# Altium schematic symbol library Regulator_Linear.SchLib: 1452 symbols (part 2 of 10)
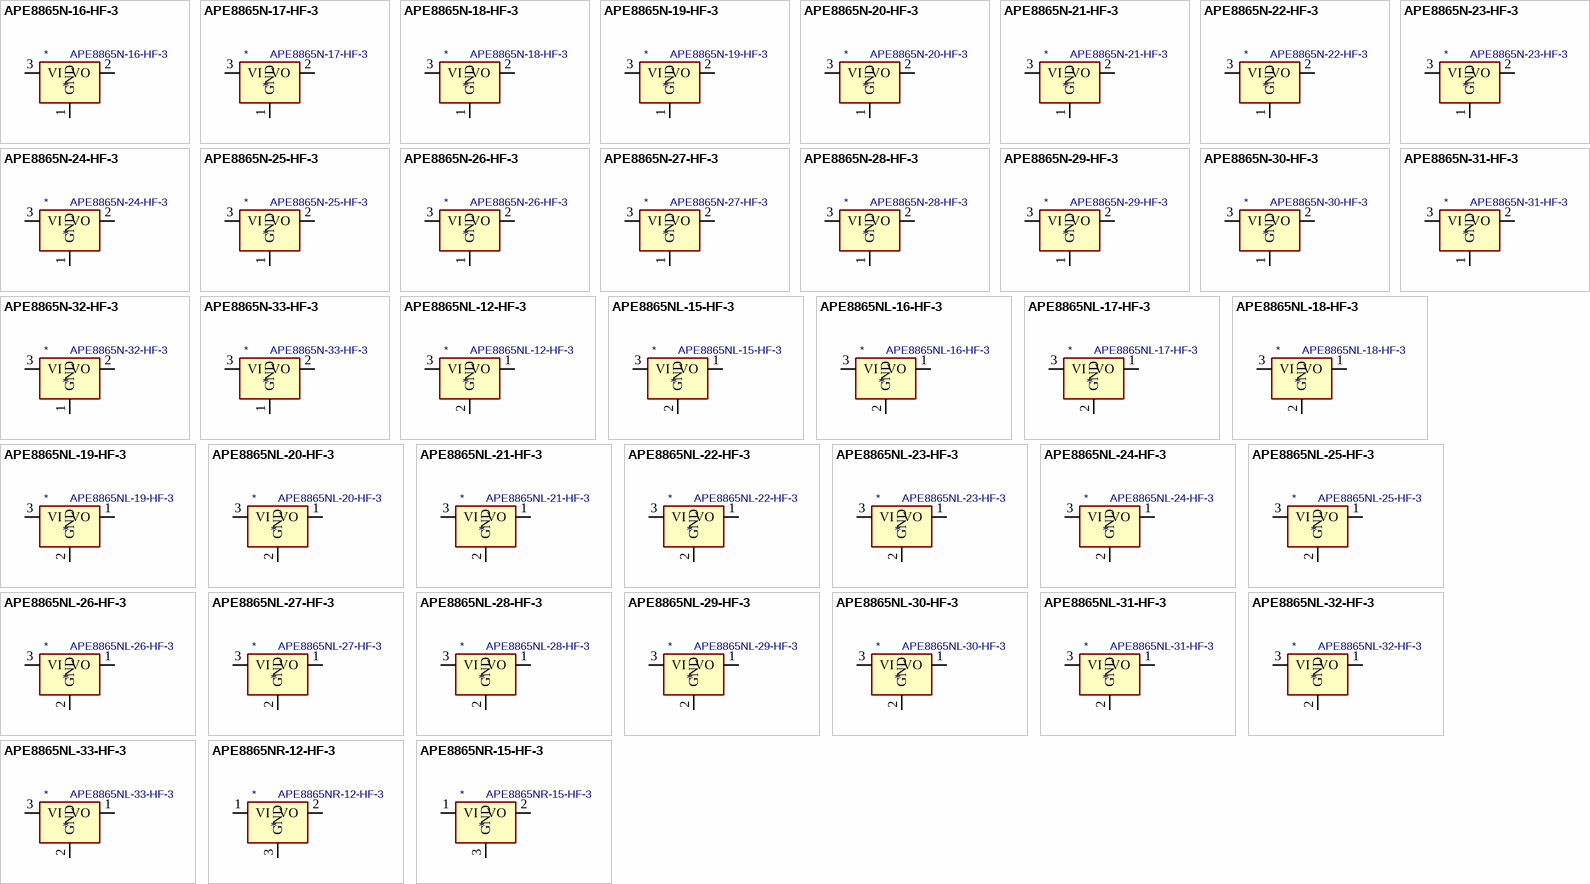
[diagram p37: symbols APE8865N-16-HF-3 to APE8865NR-15-HF-3]

## APE8865NR-15-HF-3
designator *  value APE8865NR-15-HF-3
ki_keywords: 300mA LDO Regulator Fixed Positive; ki_description: 300mA Low Dropout Voltage Regulator, Fixed Output 1.5V, SOT-23; ki_fp_filters: SOT?23*; Footprint: Package_TO_SOT_SMD:SOT-23; Supplier: http://www.tme.eu/fr/Document/ced3461ed31ea70a3c416fb648e0cde7/APE8865-3.pdf
footprint SOT-23
pins: 1 VI (power), 2 VO (power), 3 GND (power)

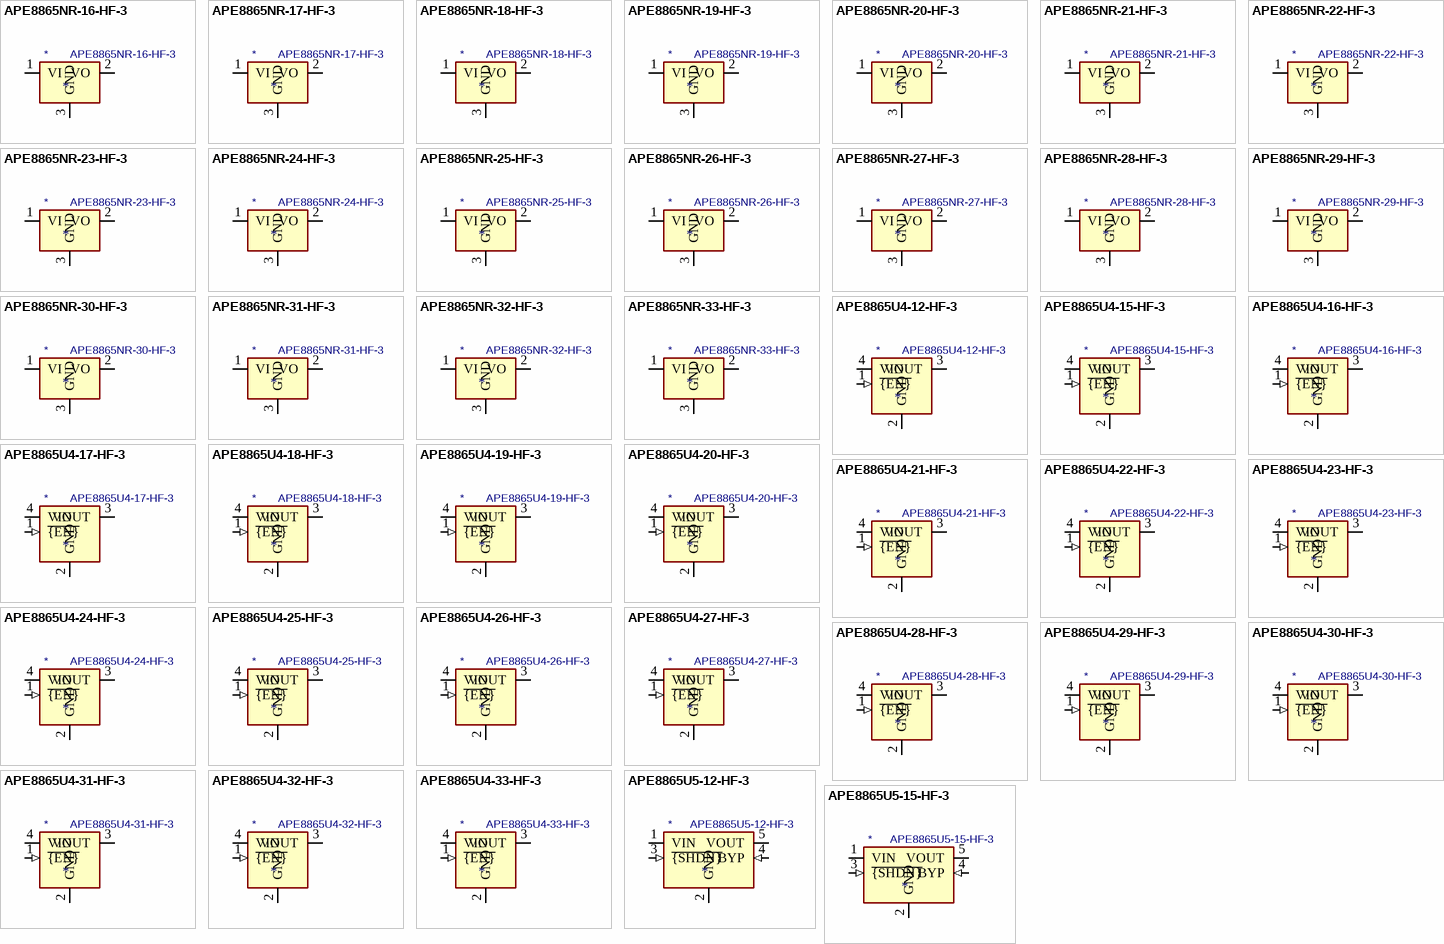
[diagram p4: symbols APE8865NR-16-HF-3 to APE8865U5-15-HF-3]

## APE8865NR-16-HF-3
designator *  value APE8865NR-16-HF-3
ki_keywords: 300mA LDO Regulator Fixed Positive; ki_description: 300mA Low Dropout Voltage Regulator, Fixed Output 1.6V, SOT-23; ki_fp_filters: SOT?23*; Footprint: Package_TO_SOT_SMD:SOT-23; Supplier: http://www.tme.eu/fr/Document/ced3461ed31ea70a3c416fb648e0cde7/APE8865-3.pdf
footprint SOT-23
pins: 1 VI (power), 2 VO (power), 3 GND (power)

## APE8865NR-17-HF-3
designator *  value APE8865NR-17-HF-3
ki_keywords: 300mA LDO Regulator Fixed Positive; ki_description: 300mA Low Dropout Voltage Regulator, Fixed Output 1.7V, SOT-23; ki_fp_filters: SOT?23*; Footprint: Package_TO_SOT_SMD:SOT-23; Supplier: http://www.tme.eu/fr/Document/ced3461ed31ea70a3c416fb648e0cde7/APE8865-3.pdf
footprint SOT-23
pins: 1 VI (power), 2 VO (power), 3 GND (power)

## APE8865NR-18-HF-3
designator *  value APE8865NR-18-HF-3
ki_keywords: 300mA LDO Regulator Fixed Positive; ki_description: 300mA Low Dropout Voltage Regulator, Fixed Output 1.8V, SOT-23; ki_fp_filters: SOT?23*; Footprint: Package_TO_SOT_SMD:SOT-23; Supplier: http://www.tme.eu/fr/Document/ced3461ed31ea70a3c416fb648e0cde7/APE8865-3.pdf
footprint SOT-23
pins: 1 VI (power), 2 VO (power), 3 GND (power)

## APE8865NR-19-HF-3
designator *  value APE8865NR-19-HF-3
ki_keywords: 300mA LDO Regulator Fixed Positive; ki_description: 300mA Low Dropout Voltage Regulator, Fixed Output 1.9V, SOT-23; ki_fp_filters: SOT?23*; Footprint: Package_TO_SOT_SMD:SOT-23; Supplier: http://www.tme.eu/fr/Document/ced3461ed31ea70a3c416fb648e0cde7/APE8865-3.pdf
footprint SOT-23
pins: 1 VI (power), 2 VO (power), 3 GND (power)

## APE8865NR-20-HF-3
designator *  value APE8865NR-20-HF-3
ki_keywords: 300mA LDO Regulator Fixed Positive; ki_description: 300mA Low Dropout Voltage Regulator, Fixed Output 2.0V, SOT-23; ki_fp_filters: SOT?23*; Footprint: Package_TO_SOT_SMD:SOT-23; Supplier: http://www.tme.eu/fr/Document/ced3461ed31ea70a3c416fb648e0cde7/APE8865-3.pdf
footprint SOT-23
pins: 1 VI (power), 2 VO (power), 3 GND (power)

## APE8865NR-21-HF-3
designator *  value APE8865NR-21-HF-3
ki_keywords: 300mA LDO Regulator Fixed Positive; ki_description: 300mA Low Dropout Voltage Regulator, Fixed Output 2.1V, SOT-23; ki_fp_filters: SOT?23*; Footprint: Package_TO_SOT_SMD:SOT-23; Supplier: http://www.tme.eu/fr/Document/ced3461ed31ea70a3c416fb648e0cde7/APE8865-3.pdf
footprint SOT-23
pins: 1 VI (power), 2 VO (power), 3 GND (power)

## APE8865NR-22-HF-3
designator *  value APE8865NR-22-HF-3
ki_keywords: 300mA LDO Regulator Fixed Positive; ki_description: 300mA Low Dropout Voltage Regulator, Fixed Output 2.2V, SOT-23; ki_fp_filters: SOT?23*; Footprint: Package_TO_SOT_SMD:SOT-23; Supplier: http://www.tme.eu/fr/Document/ced3461ed31ea70a3c416fb648e0cde7/APE8865-3.pdf
footprint SOT-23
pins: 1 VI (power), 2 VO (power), 3 GND (power)

## APE8865NR-23-HF-3
designator *  value APE8865NR-23-HF-3
ki_keywords: 300mA LDO Regulator Fixed Positive; ki_description: 300mA Low Dropout Voltage Regulator, Fixed Output 2.3V, SOT-23; ki_fp_filters: SOT?23*; Footprint: Package_TO_SOT_SMD:SOT-23; Supplier: http://www.tme.eu/fr/Document/ced3461ed31ea70a3c416fb648e0cde7/APE8865-3.pdf
footprint SOT-23
pins: 1 VI (power), 2 VO (power), 3 GND (power)

## APE8865NR-24-HF-3
designator *  value APE8865NR-24-HF-3
ki_keywords: 300mA LDO Regulator Fixed Positive; ki_description: 300mA Low Dropout Voltage Regulator, Fixed Output 2.4V, SOT-23; ki_fp_filters: SOT?23*; Footprint: Package_TO_SOT_SMD:SOT-23; Supplier: http://www.tme.eu/fr/Document/ced3461ed31ea70a3c416fb648e0cde7/APE8865-3.pdf
footprint SOT-23
pins: 1 VI (power), 2 VO (power), 3 GND (power)

## APE8865NR-25-HF-3
designator *  value APE8865NR-25-HF-3
ki_keywords: 300mA LDO Regulator Fixed Positive; ki_description: 300mA Low Dropout Voltage Regulator, Fixed Output 2.5V, SOT-23; ki_fp_filters: SOT?23*; Footprint: Package_TO_SOT_SMD:SOT-23; Supplier: http://www.tme.eu/fr/Document/ced3461ed31ea70a3c416fb648e0cde7/APE8865-3.pdf
footprint SOT-23
pins: 1 VI (power), 2 VO (power), 3 GND (power)

## APE8865NR-26-HF-3
designator *  value APE8865NR-26-HF-3
ki_keywords: 300mA LDO Regulator Fixed Positive; ki_description: 300mA Low Dropout Voltage Regulator, Fixed Output 2.6V, SOT-23; ki_fp_filters: SOT?23*; Footprint: Package_TO_SOT_SMD:SOT-23; Supplier: http://www.tme.eu/fr/Document/ced3461ed31ea70a3c416fb648e0cde7/APE8865-3.pdf
footprint SOT-23
pins: 1 VI (power), 2 VO (power), 3 GND (power)

## APE8865NR-27-HF-3
designator *  value APE8865NR-27-HF-3
ki_keywords: 300mA LDO Regulator Fixed Positive; ki_description: 300mA Low Dropout Voltage Regulator, Fixed Output 2.7V, SOT-23; ki_fp_filters: SOT?23*; Footprint: Package_TO_SOT_SMD:SOT-23; Supplier: http://www.tme.eu/fr/Document/ced3461ed31ea70a3c416fb648e0cde7/APE8865-3.pdf
footprint SOT-23
pins: 1 VI (power), 2 VO (power), 3 GND (power)

## APE8865NR-28-HF-3
designator *  value APE8865NR-28-HF-3
ki_keywords: 300mA LDO Regulator Fixed Positive; ki_description: 300mA Low Dropout Voltage Regulator, Fixed Output 2.8V, SOT-23; ki_fp_filters: SOT?23*; Footprint: Package_TO_SOT_SMD:SOT-23; Supplier: http://www.tme.eu/fr/Document/ced3461ed31ea70a3c416fb648e0cde7/APE8865-3.pdf
footprint SOT-23
pins: 1 VI (power), 2 VO (power), 3 GND (power)

## APE8865NR-29-HF-3
designator *  value APE8865NR-29-HF-3
ki_keywords: 300mA LDO Regulator Fixed Positive; ki_description: 300mA Low Dropout Voltage Regulator, Fixed Output 2.9V, SOT-23; ki_fp_filters: SOT?23*; Footprint: Package_TO_SOT_SMD:SOT-23; Supplier: http://www.tme.eu/fr/Document/ced3461ed31ea70a3c416fb648e0cde7/APE8865-3.pdf
footprint SOT-23
pins: 1 VI (power), 2 VO (power), 3 GND (power)

## APE8865NR-30-HF-3
designator *  value APE8865NR-30-HF-3
ki_keywords: 300mA LDO Regulator Fixed Positive; ki_description: 300mA Low Dropout Voltage Regulator, Fixed Output 3.0V, SOT-23; ki_fp_filters: SOT?23*; Footprint: Package_TO_SOT_SMD:SOT-23; Supplier: http://www.tme.eu/fr/Document/ced3461ed31ea70a3c416fb648e0cde7/APE8865-3.pdf
footprint SOT-23
pins: 1 VI (power), 2 VO (power), 3 GND (power)

## APE8865NR-31-HF-3
designator *  value APE8865NR-31-HF-3
ki_keywords: 300mA LDO Regulator Fixed Positive; ki_description: 300mA Low Dropout Voltage Regulator, Fixed Output 3.1V, SOT-23; ki_fp_filters: SOT?23*; Footprint: Package_TO_SOT_SMD:SOT-23; Supplier: http://www.tme.eu/fr/Document/ced3461ed31ea70a3c416fb648e0cde7/APE8865-3.pdf
footprint SOT-23
pins: 1 VI (power), 2 VO (power), 3 GND (power)

## APE8865NR-32-HF-3
designator *  value APE8865NR-32-HF-3
ki_keywords: 300mA LDO Regulator Fixed Positive; ki_description: 300mA Low Dropout Voltage Regulator, Fixed Output 3.2V, SOT-23; ki_fp_filters: SOT?23*; Footprint: Package_TO_SOT_SMD:SOT-23; Supplier: http://www.tme.eu/fr/Document/ced3461ed31ea70a3c416fb648e0cde7/APE8865-3.pdf
footprint SOT-23
pins: 1 VI (power), 2 VO (power), 3 GND (power)

## APE8865NR-33-HF-3
designator *  value APE8865NR-33-HF-3
ki_keywords: 300mA LDO Regulator Fixed Positive; ki_description: 300mA Low Dropout Voltage Regulator, Fixed Output 3.3V, SOT-23; ki_fp_filters: SOT?23*; Footprint: Package_TO_SOT_SMD:SOT-23; Supplier: http://www.tme.eu/fr/Document/ced3461ed31ea70a3c416fb648e0cde7/APE8865-3.pdf
footprint SOT-23
pins: 1 VI (power), 2 VO (power), 3 GND (power)

## APE8865U4-12-HF-3
designator *  value APE8865U4-12-HF-3
ki_keywords: 300mA LDO Regulator Fixed Positive; ki_description: 300mA Low Dropout Voltage Regulator, Fixed Output 1.2V, SC-70-4; ki_fp_filters: *SC?70*; Footprint: Package_TO_SOT_SMD:SOT-343_SC-70-4; Supplier: http://www.tme.eu/fr/Document/ced3461ed31ea70a3c416fb648e0cde7/APE8865-3.pdf
footprint SOT-343_SC-70-4
pins: 1 ~{{EN}} (in), 2 GND (power), 3 VOUT (power), 4 VIN (power)

## APE8865U4-15-HF-3
designator *  value APE8865U4-15-HF-3
ki_keywords: 300mA LDO Regulator Fixed Positive; ki_description: 300mA Low Dropout Voltage Regulator, Fixed Output 1.5V, SC-70-4; ki_fp_filters: *SC?70*; Footprint: Package_TO_SOT_SMD:SOT-343_SC-70-4; Supplier: http://www.tme.eu/fr/Document/ced3461ed31ea70a3c416fb648e0cde7/APE8865-3.pdf
footprint SOT-343_SC-70-4
pins: 1 ~{{EN}} (in), 2 GND (power), 3 VOUT (power), 4 VIN (power)

## APE8865U4-16-HF-3
designator *  value APE8865U4-16-HF-3
ki_keywords: 300mA LDO Regulator Fixed Positive; ki_description: 300mA Low Dropout Voltage Regulator, Fixed Output 1.6V, SC-70-4; ki_fp_filters: *SC?70*; Footprint: Package_TO_SOT_SMD:SOT-343_SC-70-4; Supplier: http://www.tme.eu/fr/Document/ced3461ed31ea70a3c416fb648e0cde7/APE8865-3.pdf
footprint SOT-343_SC-70-4
pins: 1 ~{{EN}} (in), 2 GND (power), 3 VOUT (power), 4 VIN (power)

## APE8865U4-17-HF-3
designator *  value APE8865U4-17-HF-3
ki_keywords: 300mA LDO Regulator Fixed Positive; ki_description: 300mA Low Dropout Voltage Regulator, Fixed Output 1.7V, SC-70-4; ki_fp_filters: *SC?70*; Footprint: Package_TO_SOT_SMD:SOT-343_SC-70-4; Supplier: http://www.tme.eu/fr/Document/ced3461ed31ea70a3c416fb648e0cde7/APE8865-3.pdf
footprint SOT-343_SC-70-4
pins: 1 ~{{EN}} (in), 2 GND (power), 3 VOUT (power), 4 VIN (power)

## APE8865U4-18-HF-3
designator *  value APE8865U4-18-HF-3
ki_keywords: 300mA LDO Regulator Fixed Positive; ki_description: 300mA Low Dropout Voltage Regulator, Fixed Output 1.8V, SC-70-4; ki_fp_filters: *SC?70*; Footprint: Package_TO_SOT_SMD:SOT-343_SC-70-4; Supplier: http://www.tme.eu/fr/Document/ced3461ed31ea70a3c416fb648e0cde7/APE8865-3.pdf
footprint SOT-343_SC-70-4
pins: 1 ~{{EN}} (in), 2 GND (power), 3 VOUT (power), 4 VIN (power)

## APE8865U4-19-HF-3
designator *  value APE8865U4-19-HF-3
ki_keywords: 300mA LDO Regulator Fixed Positive; ki_description: 300mA Low Dropout Voltage Regulator, Fixed Output 1.9V, SC-70-4; ki_fp_filters: *SC?70*; Footprint: Package_TO_SOT_SMD:SOT-343_SC-70-4; Supplier: http://www.tme.eu/fr/Document/ced3461ed31ea70a3c416fb648e0cde7/APE8865-3.pdf
footprint SOT-343_SC-70-4
pins: 1 ~{{EN}} (in), 2 GND (power), 3 VOUT (power), 4 VIN (power)

## APE8865U4-20-HF-3
designator *  value APE8865U4-20-HF-3
ki_keywords: 300mA LDO Regulator Fixed Positive; ki_description: 300mA Low Dropout Voltage Regulator, Fixed Output 2.0V, SC-70-4; ki_fp_filters: *SC?70*; Footprint: Package_TO_SOT_SMD:SOT-343_SC-70-4; Supplier: http://www.tme.eu/fr/Document/ced3461ed31ea70a3c416fb648e0cde7/APE8865-3.pdf
footprint SOT-343_SC-70-4
pins: 1 ~{{EN}} (in), 2 GND (power), 3 VOUT (power), 4 VIN (power)

## APE8865U4-21-HF-3
designator *  value APE8865U4-21-HF-3
ki_keywords: 300mA LDO Regulator Fixed Positive; ki_description: 300mA Low Dropout Voltage Regulator, Fixed Output 2.1V, SC-70-4; ki_fp_filters: *SC?70*; Footprint: Package_TO_SOT_SMD:SOT-343_SC-70-4; Supplier: http://www.tme.eu/fr/Document/ced3461ed31ea70a3c416fb648e0cde7/APE8865-3.pdf
footprint SOT-343_SC-70-4
pins: 1 ~{{EN}} (in), 2 GND (power), 3 VOUT (power), 4 VIN (power)

## APE8865U4-22-HF-3
designator *  value APE8865U4-22-HF-3
ki_keywords: 300mA LDO Regulator Fixed Positive; ki_description: 300mA Low Dropout Voltage Regulator, Fixed Output 2.2V, SC-70-4; ki_fp_filters: *SC?70*; Footprint: Package_TO_SOT_SMD:SOT-343_SC-70-4; Supplier: http://www.tme.eu/fr/Document/ced3461ed31ea70a3c416fb648e0cde7/APE8865-3.pdf
footprint SOT-343_SC-70-4
pins: 1 ~{{EN}} (in), 2 GND (power), 3 VOUT (power), 4 VIN (power)

## APE8865U4-23-HF-3
designator *  value APE8865U4-23-HF-3
ki_keywords: 300mA LDO Regulator Fixed Positive; ki_description: 300mA Low Dropout Voltage Regulator, Fixed Output 2.3V, SC-70-4; ki_fp_filters: *SC?70*; Footprint: Package_TO_SOT_SMD:SOT-343_SC-70-4; Supplier: http://www.tme.eu/fr/Document/ced3461ed31ea70a3c416fb648e0cde7/APE8865-3.pdf
footprint SOT-343_SC-70-4
pins: 1 ~{{EN}} (in), 2 GND (power), 3 VOUT (power), 4 VIN (power)

## APE8865U4-24-HF-3
designator *  value APE8865U4-24-HF-3
ki_keywords: 300mA LDO Regulator Fixed Positive; ki_description: 300mA Low Dropout Voltage Regulator, Fixed Output 2.4V, SC-70-4; ki_fp_filters: *SC?70*; Footprint: Package_TO_SOT_SMD:SOT-343_SC-70-4; Supplier: http://www.tme.eu/fr/Document/ced3461ed31ea70a3c416fb648e0cde7/APE8865-3.pdf
footprint SOT-343_SC-70-4
pins: 1 ~{{EN}} (in), 2 GND (power), 3 VOUT (power), 4 VIN (power)

## APE8865U4-25-HF-3
designator *  value APE8865U4-25-HF-3
ki_keywords: 300mA LDO Regulator Fixed Positive; ki_description: 300mA Low Dropout Voltage Regulator, Fixed Output 2.5V, SC-70-4; ki_fp_filters: *SC?70*; Footprint: Package_TO_SOT_SMD:SOT-343_SC-70-4; Supplier: http://www.tme.eu/fr/Document/ced3461ed31ea70a3c416fb648e0cde7/APE8865-3.pdf
footprint SOT-343_SC-70-4
pins: 1 ~{{EN}} (in), 2 GND (power), 3 VOUT (power), 4 VIN (power)

## APE8865U4-26-HF-3
designator *  value APE8865U4-26-HF-3
ki_keywords: 300mA LDO Regulator Fixed Positive; ki_description: 300mA Low Dropout Voltage Regulator, Fixed Output 2.6V, SC-70-4; ki_fp_filters: *SC?70*; Footprint: Package_TO_SOT_SMD:SOT-343_SC-70-4; Supplier: http://www.tme.eu/fr/Document/ced3461ed31ea70a3c416fb648e0cde7/APE8865-3.pdf
footprint SOT-343_SC-70-4
pins: 1 ~{{EN}} (in), 2 GND (power), 3 VOUT (power), 4 VIN (power)

## APE8865U4-27-HF-3
designator *  value APE8865U4-27-HF-3
ki_keywords: 300mA LDO Regulator Fixed Positive; ki_description: 300mA Low Dropout Voltage Regulator, Fixed Output 2.7V, SC-70-4; ki_fp_filters: *SC?70*; Footprint: Package_TO_SOT_SMD:SOT-343_SC-70-4; Supplier: http://www.tme.eu/fr/Document/ced3461ed31ea70a3c416fb648e0cde7/APE8865-3.pdf
footprint SOT-343_SC-70-4
pins: 1 ~{{EN}} (in), 2 GND (power), 3 VOUT (power), 4 VIN (power)

## APE8865U4-28-HF-3
designator *  value APE8865U4-28-HF-3
ki_keywords: 300mA LDO Regulator Fixed Positive; ki_description: 300mA Low Dropout Voltage Regulator, Fixed Output 2.8V, SC-70-4; ki_fp_filters: *SC?70*; Footprint: Package_TO_SOT_SMD:SOT-343_SC-70-4; Supplier: http://www.tme.eu/fr/Document/ced3461ed31ea70a3c416fb648e0cde7/APE8865-3.pdf
footprint SOT-343_SC-70-4
pins: 1 ~{{EN}} (in), 2 GND (power), 3 VOUT (power), 4 VIN (power)

## APE8865U4-29-HF-3
designator *  value APE8865U4-29-HF-3
ki_keywords: 300mA LDO Regulator Fixed Positive; ki_description: 300mA Low Dropout Voltage Regulator, Fixed Output 2.9V, SC-70-4; ki_fp_filters: *SC?70*; Footprint: Package_TO_SOT_SMD:SOT-343_SC-70-4; Supplier: http://www.tme.eu/fr/Document/ced3461ed31ea70a3c416fb648e0cde7/APE8865-3.pdf
footprint SOT-343_SC-70-4
pins: 1 ~{{EN}} (in), 2 GND (power), 3 VOUT (power), 4 VIN (power)

## APE8865U4-30-HF-3
designator *  value APE8865U4-30-HF-3
ki_keywords: 300mA LDO Regulator Fixed Positive; ki_description: 300mA Low Dropout Voltage Regulator, Fixed Output 3.0V, SC-70-4; ki_fp_filters: *SC?70*; Footprint: Package_TO_SOT_SMD:SOT-343_SC-70-4; Supplier: http://www.tme.eu/fr/Document/ced3461ed31ea70a3c416fb648e0cde7/APE8865-3.pdf
footprint SOT-343_SC-70-4
pins: 1 ~{{EN}} (in), 2 GND (power), 3 VOUT (power), 4 VIN (power)

## APE8865U4-31-HF-3
designator *  value APE8865U4-31-HF-3
ki_keywords: 300mA LDO Regulator Fixed Positive; ki_description: 300mA Low Dropout Voltage Regulator, Fixed Output 3.1V, SC-70-4; ki_fp_filters: *SC?70*; Footprint: Package_TO_SOT_SMD:SOT-343_SC-70-4; Supplier: http://www.tme.eu/fr/Document/ced3461ed31ea70a3c416fb648e0cde7/APE8865-3.pdf
footprint SOT-343_SC-70-4
pins: 1 ~{{EN}} (in), 2 GND (power), 3 VOUT (power), 4 VIN (power)

## APE8865U4-32-HF-3
designator *  value APE8865U4-32-HF-3
ki_keywords: 300mA LDO Regulator Fixed Positive; ki_description: 300mA Low Dropout Voltage Regulator, Fixed Output 3.2V, SC-70-4; ki_fp_filters: *SC?70*; Footprint: Package_TO_SOT_SMD:SOT-343_SC-70-4; Supplier: http://www.tme.eu/fr/Document/ced3461ed31ea70a3c416fb648e0cde7/APE8865-3.pdf
footprint SOT-343_SC-70-4
pins: 1 ~{{EN}} (in), 2 GND (power), 3 VOUT (power), 4 VIN (power)

## APE8865U4-33-HF-3
designator *  value APE8865U4-33-HF-3
ki_keywords: 300mA LDO Regulator Fixed Positive; ki_description: 300mA Low Dropout Voltage Regulator, Fixed Output 3.3V, SC-70-4; ki_fp_filters: *SC?70*; Footprint: Package_TO_SOT_SMD:SOT-343_SC-70-4; Supplier: http://www.tme.eu/fr/Document/ced3461ed31ea70a3c416fb648e0cde7/APE8865-3.pdf
footprint SOT-343_SC-70-4
pins: 1 ~{{EN}} (in), 2 GND (power), 3 VOUT (power), 4 VIN (power)

## APE8865U5-12-HF-3
designator *  value APE8865U5-12-HF-3
ki_keywords: 300mA LDO Regulator Fixed Positive; ki_description: 300mA Low Dropout Voltage Regulator, Fixed Output 1.2V, SC-70-5; ki_fp_filters: *SC?70*; Footprint: Package_TO_SOT_SMD:SOT-353_SC-70-5; Supplier: http://www.tme.eu/fr/Document/ced3461ed31ea70a3c416fb648e0cde7/APE8865-3.pdf
footprint SOT-353_SC-70-5
pins: 1 VIN (power), 2 GND (power), 3 ~{{SHDN}} (in), 4 BYP (in), 5 VOUT (power)

## APE8865U5-15-HF-3
designator *  value APE8865U5-15-HF-3
ki_keywords: 300mA LDO Regulator Fixed Positive; ki_description: 300mA Low Dropout Voltage Regulator, Fixed Output 1.5V, SC-70-5; ki_fp_filters: *SC?70*; Footprint: Package_TO_SOT_SMD:SOT-353_SC-70-5; Supplier: http://www.tme.eu/fr/Document/ced3461ed31ea70a3c416fb648e0cde7/APE8865-3.pdf
footprint SOT-353_SC-70-5
pins: 1 VIN (power), 2 GND (power), 3 ~{{SHDN}} (in), 4 BYP (in), 5 VOUT (power)

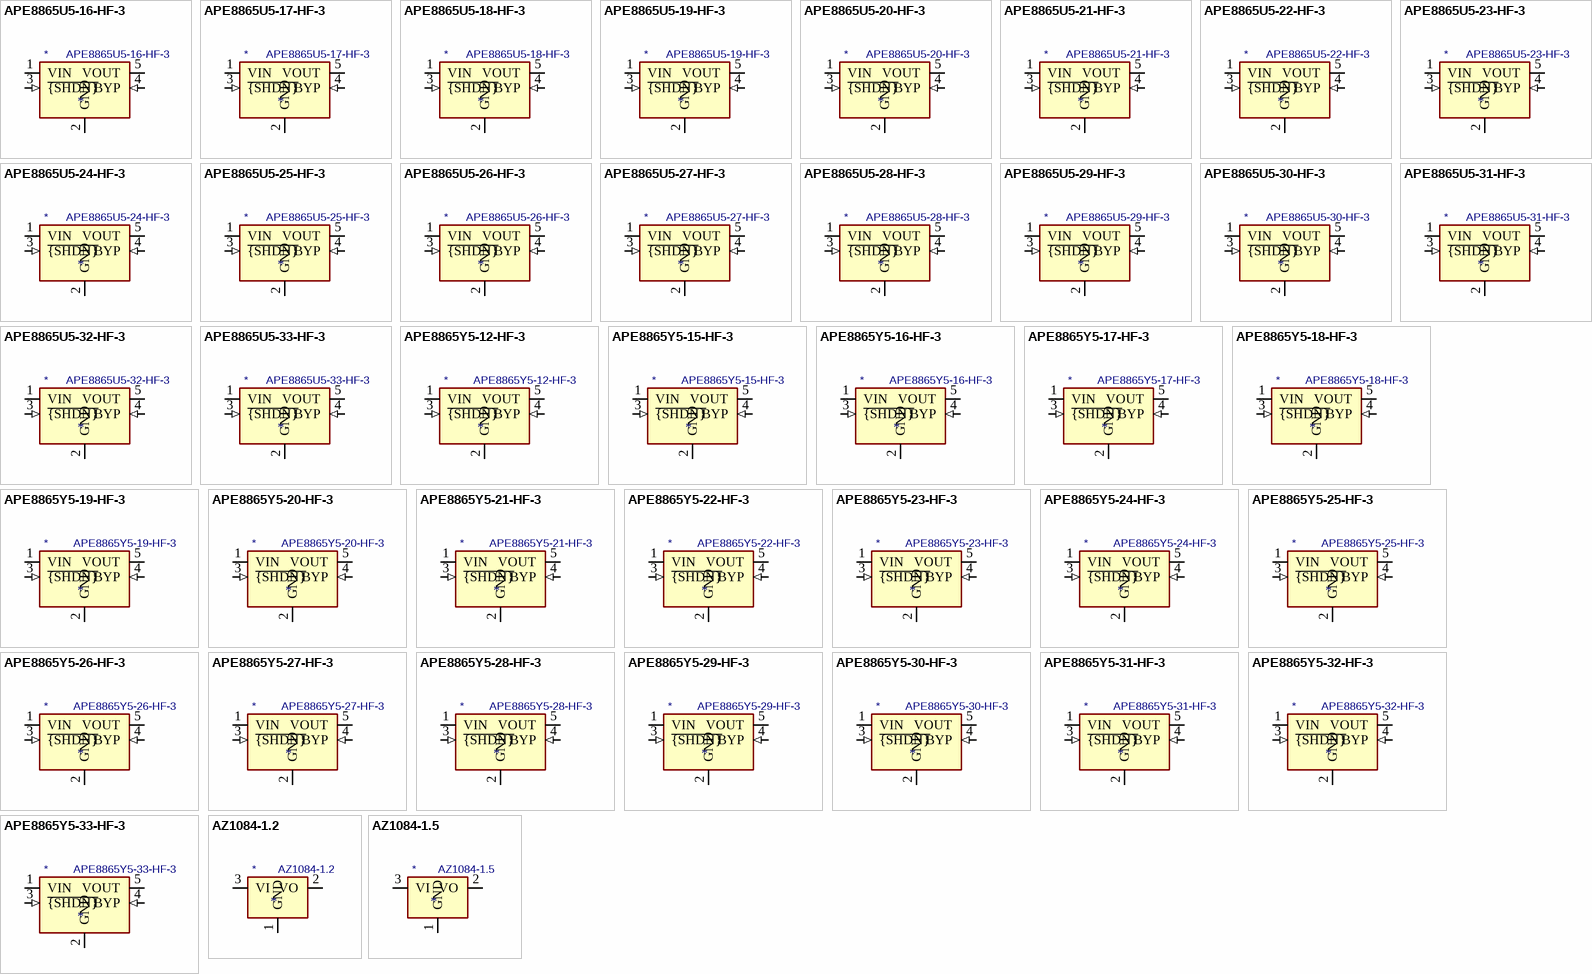
[diagram p5: symbols APE8865U5-16-HF-3 to AZ1084-1.5]

## APE8865U5-16-HF-3
designator *  value APE8865U5-16-HF-3
ki_keywords: 300mA LDO Regulator Fixed Positive; ki_description: 300mA Low Dropout Voltage Regulator, Fixed Output 1.6V, SC-70-5; ki_fp_filters: *SC?70*; Footprint: Package_TO_SOT_SMD:SOT-353_SC-70-5; Supplier: http://www.tme.eu/fr/Document/ced3461ed31ea70a3c416fb648e0cde7/APE8865-3.pdf
footprint SOT-353_SC-70-5
pins: 1 VIN (power), 2 GND (power), 3 ~{{SHDN}} (in), 4 BYP (in), 5 VOUT (power)

## APE8865U5-17-HF-3
designator *  value APE8865U5-17-HF-3
ki_keywords: 300mA LDO Regulator Fixed Positive; ki_description: 300mA Low Dropout Voltage Regulator, Fixed Output 1.7V, SC-70-5; ki_fp_filters: *SC?70*; Footprint: Package_TO_SOT_SMD:SOT-353_SC-70-5; Supplier: http://www.tme.eu/fr/Document/ced3461ed31ea70a3c416fb648e0cde7/APE8865-3.pdf
footprint SOT-353_SC-70-5
pins: 1 VIN (power), 2 GND (power), 3 ~{{SHDN}} (in), 4 BYP (in), 5 VOUT (power)

## APE8865U5-18-HF-3
designator *  value APE8865U5-18-HF-3
ki_keywords: 300mA LDO Regulator Fixed Positive; ki_description: 300mA Low Dropout Voltage Regulator, Fixed Output 1.8V, SC-70-5; ki_fp_filters: *SC?70*; Footprint: Package_TO_SOT_SMD:SOT-353_SC-70-5; Supplier: http://www.tme.eu/fr/Document/ced3461ed31ea70a3c416fb648e0cde7/APE8865-3.pdf
footprint SOT-353_SC-70-5
pins: 1 VIN (power), 2 GND (power), 3 ~{{SHDN}} (in), 4 BYP (in), 5 VOUT (power)

## APE8865U5-19-HF-3
designator *  value APE8865U5-19-HF-3
ki_keywords: 300mA LDO Regulator Fixed Positive; ki_description: 300mA Low Dropout Voltage Regulator, Fixed Output 1.9V, SC-70-5; ki_fp_filters: *SC?70*; Footprint: Package_TO_SOT_SMD:SOT-353_SC-70-5; Supplier: http://www.tme.eu/fr/Document/ced3461ed31ea70a3c416fb648e0cde7/APE8865-3.pdf
footprint SOT-353_SC-70-5
pins: 1 VIN (power), 2 GND (power), 3 ~{{SHDN}} (in), 4 BYP (in), 5 VOUT (power)

## APE8865U5-20-HF-3
designator *  value APE8865U5-20-HF-3
ki_keywords: 300mA LDO Regulator Fixed Positive; ki_description: 300mA Low Dropout Voltage Regulator, Fixed Output 2.0V, SC-70-5; ki_fp_filters: *SC?70*; Footprint: Package_TO_SOT_SMD:SOT-353_SC-70-5; Supplier: http://www.tme.eu/fr/Document/ced3461ed31ea70a3c416fb648e0cde7/APE8865-3.pdf
footprint SOT-353_SC-70-5
pins: 1 VIN (power), 2 GND (power), 3 ~{{SHDN}} (in), 4 BYP (in), 5 VOUT (power)

## APE8865U5-21-HF-3
designator *  value APE8865U5-21-HF-3
ki_keywords: 300mA LDO Regulator Fixed Positive; ki_description: 300mA Low Dropout Voltage Regulator, Fixed Output 2.1V, SC-70-5; ki_fp_filters: *SC?70*; Footprint: Package_TO_SOT_SMD:SOT-353_SC-70-5; Supplier: http://www.tme.eu/fr/Document/ced3461ed31ea70a3c416fb648e0cde7/APE8865-3.pdf
footprint SOT-353_SC-70-5
pins: 1 VIN (power), 2 GND (power), 3 ~{{SHDN}} (in), 4 BYP (in), 5 VOUT (power)

## APE8865U5-22-HF-3
designator *  value APE8865U5-22-HF-3
ki_keywords: 300mA LDO Regulator Fixed Positive; ki_description: 300mA Low Dropout Voltage Regulator, Fixed Output 2.2V, SC-70-5; ki_fp_filters: *SC?70*; Footprint: Package_TO_SOT_SMD:SOT-353_SC-70-5; Supplier: http://www.tme.eu/fr/Document/ced3461ed31ea70a3c416fb648e0cde7/APE8865-3.pdf
footprint SOT-353_SC-70-5
pins: 1 VIN (power), 2 GND (power), 3 ~{{SHDN}} (in), 4 BYP (in), 5 VOUT (power)

## APE8865U5-23-HF-3
designator *  value APE8865U5-23-HF-3
ki_keywords: 300mA LDO Regulator Fixed Positive; ki_description: 300mA Low Dropout Voltage Regulator, Fixed Output 2.3V, SC-70-5; ki_fp_filters: *SC?70*; Footprint: Package_TO_SOT_SMD:SOT-353_SC-70-5; Supplier: http://www.tme.eu/fr/Document/ced3461ed31ea70a3c416fb648e0cde7/APE8865-3.pdf
footprint SOT-353_SC-70-5
pins: 1 VIN (power), 2 GND (power), 3 ~{{SHDN}} (in), 4 BYP (in), 5 VOUT (power)

## APE8865U5-24-HF-3
designator *  value APE8865U5-24-HF-3
ki_keywords: 300mA LDO Regulator Fixed Positive; ki_description: 300mA Low Dropout Voltage Regulator, Fixed Output 2.4V, SC-70-5; ki_fp_filters: *SC?70*; Footprint: Package_TO_SOT_SMD:SOT-353_SC-70-5; Supplier: http://www.tme.eu/fr/Document/ced3461ed31ea70a3c416fb648e0cde7/APE8865-3.pdf
footprint SOT-353_SC-70-5
pins: 1 VIN (power), 2 GND (power), 3 ~{{SHDN}} (in), 4 BYP (in), 5 VOUT (power)

## APE8865U5-25-HF-3
designator *  value APE8865U5-25-HF-3
ki_keywords: 300mA LDO Regulator Fixed Positive; ki_description: 300mA Low Dropout Voltage Regulator, Fixed Output 2.5V, SC-70-5; ki_fp_filters: *SC?70*; Footprint: Package_TO_SOT_SMD:SOT-353_SC-70-5; Supplier: http://www.tme.eu/fr/Document/ced3461ed31ea70a3c416fb648e0cde7/APE8865-3.pdf
footprint SOT-353_SC-70-5
pins: 1 VIN (power), 2 GND (power), 3 ~{{SHDN}} (in), 4 BYP (in), 5 VOUT (power)

## APE8865U5-26-HF-3
designator *  value APE8865U5-26-HF-3
ki_keywords: 300mA LDO Regulator Fixed Positive; ki_description: 300mA Low Dropout Voltage Regulator, Fixed Output 2.6V, SC-70-5; ki_fp_filters: *SC?70*; Footprint: Package_TO_SOT_SMD:SOT-353_SC-70-5; Supplier: http://www.tme.eu/fr/Document/ced3461ed31ea70a3c416fb648e0cde7/APE8865-3.pdf
footprint SOT-353_SC-70-5
pins: 1 VIN (power), 2 GND (power), 3 ~{{SHDN}} (in), 4 BYP (in), 5 VOUT (power)

## APE8865U5-27-HF-3
designator *  value APE8865U5-27-HF-3
ki_keywords: 300mA LDO Regulator Fixed Positive; ki_description: 300mA Low Dropout Voltage Regulator, Fixed Output 2.7V, SC-70-5; ki_fp_filters: *SC?70*; Footprint: Package_TO_SOT_SMD:SOT-353_SC-70-5; Supplier: http://www.tme.eu/fr/Document/ced3461ed31ea70a3c416fb648e0cde7/APE8865-3.pdf
footprint SOT-353_SC-70-5
pins: 1 VIN (power), 2 GND (power), 3 ~{{SHDN}} (in), 4 BYP (in), 5 VOUT (power)

## APE8865U5-28-HF-3
designator *  value APE8865U5-28-HF-3
ki_keywords: 300mA LDO Regulator Fixed Positive; ki_description: 300mA Low Dropout Voltage Regulator, Fixed Output 2.8V, SC-70-5; ki_fp_filters: *SC?70*; Footprint: Package_TO_SOT_SMD:SOT-353_SC-70-5; Supplier: http://www.tme.eu/fr/Document/ced3461ed31ea70a3c416fb648e0cde7/APE8865-3.pdf
footprint SOT-353_SC-70-5
pins: 1 VIN (power), 2 GND (power), 3 ~{{SHDN}} (in), 4 BYP (in), 5 VOUT (power)

## APE8865U5-29-HF-3
designator *  value APE8865U5-29-HF-3
ki_keywords: 300mA LDO Regulator Fixed Positive; ki_description: 300mA Low Dropout Voltage Regulator, Fixed Output 2.9V, SC-70-5; ki_fp_filters: *SC?70*; Footprint: Package_TO_SOT_SMD:SOT-353_SC-70-5; Supplier: http://www.tme.eu/fr/Document/ced3461ed31ea70a3c416fb648e0cde7/APE8865-3.pdf
footprint SOT-353_SC-70-5
pins: 1 VIN (power), 2 GND (power), 3 ~{{SHDN}} (in), 4 BYP (in), 5 VOUT (power)

## APE8865U5-30-HF-3
designator *  value APE8865U5-30-HF-3
ki_keywords: 300mA LDO Regulator Fixed Positive; ki_description: 300mA Low Dropout Voltage Regulator, Fixed Output 3.0V, SC-70-5; ki_fp_filters: *SC?70*; Footprint: Package_TO_SOT_SMD:SOT-353_SC-70-5; Supplier: http://www.tme.eu/fr/Document/ced3461ed31ea70a3c416fb648e0cde7/APE8865-3.pdf
footprint SOT-353_SC-70-5
pins: 1 VIN (power), 2 GND (power), 3 ~{{SHDN}} (in), 4 BYP (in), 5 VOUT (power)

## APE8865U5-31-HF-3
designator *  value APE8865U5-31-HF-3
ki_keywords: 300mA LDO Regulator Fixed Positive; ki_description: 300mA Low Dropout Voltage Regulator, Fixed Output 3.1V, SC-70-5; ki_fp_filters: *SC?70*; Footprint: Package_TO_SOT_SMD:SOT-353_SC-70-5; Supplier: http://www.tme.eu/fr/Document/ced3461ed31ea70a3c416fb648e0cde7/APE8865-3.pdf
footprint SOT-353_SC-70-5
pins: 1 VIN (power), 2 GND (power), 3 ~{{SHDN}} (in), 4 BYP (in), 5 VOUT (power)

## APE8865U5-32-HF-3
designator *  value APE8865U5-32-HF-3
ki_keywords: 300mA LDO Regulator Fixed Positive; ki_description: 300mA Low Dropout Voltage Regulator, Fixed Output 3.2V, SC-70-5; ki_fp_filters: *SC?70*; Footprint: Package_TO_SOT_SMD:SOT-353_SC-70-5; Supplier: http://www.tme.eu/fr/Document/ced3461ed31ea70a3c416fb648e0cde7/APE8865-3.pdf
footprint SOT-353_SC-70-5
pins: 1 VIN (power), 2 GND (power), 3 ~{{SHDN}} (in), 4 BYP (in), 5 VOUT (power)

## APE8865U5-33-HF-3
designator *  value APE8865U5-33-HF-3
ki_keywords: 300mA LDO Regulator Fixed Positive; ki_description: 300mA Low Dropout Voltage Regulator, Fixed Output 3.3V, SC-70-5; ki_fp_filters: *SC?70*; Footprint: Package_TO_SOT_SMD:SOT-353_SC-70-5; Supplier: http://www.tme.eu/fr/Document/ced3461ed31ea70a3c416fb648e0cde7/APE8865-3.pdf
footprint SOT-353_SC-70-5
pins: 1 VIN (power), 2 GND (power), 3 ~{{SHDN}} (in), 4 BYP (in), 5 VOUT (power)

## APE8865Y5-12-HF-3
designator *  value APE8865Y5-12-HF-3
ki_keywords: 300mA LDO Regulator Fixed Positive; ki_description: 300mA Low Dropout Voltage Regulator, Fixed Output 1.2V, SOT-23-5; ki_fp_filters: SOT?23*; Footprint: Package_TO_SOT_SMD:SOT-23-5; Supplier: http://www.tme.eu/fr/Document/ced3461ed31ea70a3c416fb648e0cde7/APE8865-3.pdf
footprint SOT-23-5
pins: 1 VIN (power), 2 GND (power), 3 ~{{SHDN}} (in), 4 BYP (in), 5 VOUT (power)

## APE8865Y5-15-HF-3
designator *  value APE8865Y5-15-HF-3
ki_keywords: 300mA LDO Regulator Fixed Positive; ki_description: 300mA Low Dropout Voltage Regulator, Fixed Output 1.5V, SOT-23-5; ki_fp_filters: SOT?23*; Footprint: Package_TO_SOT_SMD:SOT-23-5; Supplier: http://www.tme.eu/fr/Document/ced3461ed31ea70a3c416fb648e0cde7/APE8865-3.pdf
footprint SOT-23-5
pins: 1 VIN (power), 2 GND (power), 3 ~{{SHDN}} (in), 4 BYP (in), 5 VOUT (power)

## APE8865Y5-16-HF-3
designator *  value APE8865Y5-16-HF-3
ki_keywords: 300mA LDO Regulator Fixed Positive; ki_description: 300mA Low Dropout Voltage Regulator, Fixed Output 1.6V, SOT-23-5; ki_fp_filters: SOT?23*; Footprint: Package_TO_SOT_SMD:SOT-23-5; Supplier: http://www.tme.eu/fr/Document/ced3461ed31ea70a3c416fb648e0cde7/APE8865-3.pdf
footprint SOT-23-5
pins: 1 VIN (power), 2 GND (power), 3 ~{{SHDN}} (in), 4 BYP (in), 5 VOUT (power)

## APE8865Y5-17-HF-3
designator *  value APE8865Y5-17-HF-3
ki_keywords: 300mA LDO Regulator Fixed Positive; ki_description: 300mA Low Dropout Voltage Regulator, Fixed Output 1.7V, SOT-23-5; ki_fp_filters: SOT?23*; Footprint: Package_TO_SOT_SMD:SOT-23-5; Supplier: http://www.tme.eu/fr/Document/ced3461ed31ea70a3c416fb648e0cde7/APE8865-3.pdf
footprint SOT-23-5
pins: 1 VIN (power), 2 GND (power), 3 ~{{SHDN}} (in), 4 BYP (in), 5 VOUT (power)

## APE8865Y5-18-HF-3
designator *  value APE8865Y5-18-HF-3
ki_keywords: 300mA LDO Regulator Fixed Positive; ki_description: 300mA Low Dropout Voltage Regulator, Fixed Output 1.8V, SOT-23-5; ki_fp_filters: SOT?23*; Footprint: Package_TO_SOT_SMD:SOT-23-5; Supplier: http://www.tme.eu/fr/Document/ced3461ed31ea70a3c416fb648e0cde7/APE8865-3.pdf
footprint SOT-23-5
pins: 1 VIN (power), 2 GND (power), 3 ~{{SHDN}} (in), 4 BYP (in), 5 VOUT (power)

## APE8865Y5-19-HF-3
designator *  value APE8865Y5-19-HF-3
ki_keywords: 300mA LDO Regulator Fixed Positive; ki_description: 300mA Low Dropout Voltage Regulator, Fixed Output 1.9V, SOT-23-5; ki_fp_filters: SOT?23*; Footprint: Package_TO_SOT_SMD:SOT-23-5; Supplier: http://www.tme.eu/fr/Document/ced3461ed31ea70a3c416fb648e0cde7/APE8865-3.pdf
footprint SOT-23-5
pins: 1 VIN (power), 2 GND (power), 3 ~{{SHDN}} (in), 4 BYP (in), 5 VOUT (power)

## APE8865Y5-20-HF-3
designator *  value APE8865Y5-20-HF-3
ki_keywords: 300mA LDO Regulator Fixed Positive; ki_description: 300mA Low Dropout Voltage Regulator, Fixed Output 2.0V, SOT-23-5; ki_fp_filters: SOT?23*; Footprint: Package_TO_SOT_SMD:SOT-23-5; Supplier: http://www.tme.eu/fr/Document/ced3461ed31ea70a3c416fb648e0cde7/APE8865-3.pdf
footprint SOT-23-5
pins: 1 VIN (power), 2 GND (power), 3 ~{{SHDN}} (in), 4 BYP (in), 5 VOUT (power)

## APE8865Y5-21-HF-3
designator *  value APE8865Y5-21-HF-3
ki_keywords: 300mA LDO Regulator Fixed Positive; ki_description: 300mA Low Dropout Voltage Regulator, Fixed Output 2.1V, SOT-23-5; ki_fp_filters: SOT?23*; Footprint: Package_TO_SOT_SMD:SOT-23-5; Supplier: http://www.tme.eu/fr/Document/ced3461ed31ea70a3c416fb648e0cde7/APE8865-3.pdf
footprint SOT-23-5
pins: 1 VIN (power), 2 GND (power), 3 ~{{SHDN}} (in), 4 BYP (in), 5 VOUT (power)

## APE8865Y5-22-HF-3
designator *  value APE8865Y5-22-HF-3
ki_keywords: 300mA LDO Regulator Fixed Positive; ki_description: 300mA Low Dropout Voltage Regulator, Fixed Output 2.2V, SOT-23-5; ki_fp_filters: SOT?23*; Footprint: Package_TO_SOT_SMD:SOT-23-5; Supplier: http://www.tme.eu/fr/Document/ced3461ed31ea70a3c416fb648e0cde7/APE8865-3.pdf
footprint SOT-23-5
pins: 1 VIN (power), 2 GND (power), 3 ~{{SHDN}} (in), 4 BYP (in), 5 VOUT (power)

## APE8865Y5-23-HF-3
designator *  value APE8865Y5-23-HF-3
ki_keywords: 300mA LDO Regulator Fixed Positive; ki_description: 300mA Low Dropout Voltage Regulator, Fixed Output 2.3V, SOT-23-5; ki_fp_filters: SOT?23*; Footprint: Package_TO_SOT_SMD:SOT-23-5; Supplier: http://www.tme.eu/fr/Document/ced3461ed31ea70a3c416fb648e0cde7/APE8865-3.pdf
footprint SOT-23-5
pins: 1 VIN (power), 2 GND (power), 3 ~{{SHDN}} (in), 4 BYP (in), 5 VOUT (power)

## APE8865Y5-24-HF-3
designator *  value APE8865Y5-24-HF-3
ki_keywords: 300mA LDO Regulator Fixed Positive; ki_description: 300mA Low Dropout Voltage Regulator, Fixed Output 2.4V, SOT-23-5; ki_fp_filters: SOT?23*; Footprint: Package_TO_SOT_SMD:SOT-23-5; Supplier: http://www.tme.eu/fr/Document/ced3461ed31ea70a3c416fb648e0cde7/APE8865-3.pdf
footprint SOT-23-5
pins: 1 VIN (power), 2 GND (power), 3 ~{{SHDN}} (in), 4 BYP (in), 5 VOUT (power)

## APE8865Y5-25-HF-3
designator *  value APE8865Y5-25-HF-3
ki_keywords: 300mA LDO Regulator Fixed Positive; ki_description: 300mA Low Dropout Voltage Regulator, Fixed Output 2.5V, SOT-23-5; ki_fp_filters: SOT?23*; Footprint: Package_TO_SOT_SMD:SOT-23-5; Supplier: http://www.tme.eu/fr/Document/ced3461ed31ea70a3c416fb648e0cde7/APE8865-3.pdf
footprint SOT-23-5
pins: 1 VIN (power), 2 GND (power), 3 ~{{SHDN}} (in), 4 BYP (in), 5 VOUT (power)

## APE8865Y5-26-HF-3
designator *  value APE8865Y5-26-HF-3
ki_keywords: 300mA LDO Regulator Fixed Positive; ki_description: 300mA Low Dropout Voltage Regulator, Fixed Output 2.6V, SOT-23-5; ki_fp_filters: SOT?23*; Footprint: Package_TO_SOT_SMD:SOT-23-5; Supplier: http://www.tme.eu/fr/Document/ced3461ed31ea70a3c416fb648e0cde7/APE8865-3.pdf
footprint SOT-23-5
pins: 1 VIN (power), 2 GND (power), 3 ~{{SHDN}} (in), 4 BYP (in), 5 VOUT (power)

## APE8865Y5-27-HF-3
designator *  value APE8865Y5-27-HF-3
ki_keywords: 300mA LDO Regulator Fixed Positive; ki_description: 300mA Low Dropout Voltage Regulator, Fixed Output 2.7V, SOT-23-5; ki_fp_filters: SOT?23*; Footprint: Package_TO_SOT_SMD:SOT-23-5; Supplier: http://www.tme.eu/fr/Document/ced3461ed31ea70a3c416fb648e0cde7/APE8865-3.pdf
footprint SOT-23-5
pins: 1 VIN (power), 2 GND (power), 3 ~{{SHDN}} (in), 4 BYP (in), 5 VOUT (power)

## APE8865Y5-28-HF-3
designator *  value APE8865Y5-28-HF-3
ki_keywords: 300mA LDO Regulator Fixed Positive; ki_description: 300mA Low Dropout Voltage Regulator, Fixed Output 2.8V, SOT-23-5; ki_fp_filters: SOT?23*; Footprint: Package_TO_SOT_SMD:SOT-23-5; Supplier: http://www.tme.eu/fr/Document/ced3461ed31ea70a3c416fb648e0cde7/APE8865-3.pdf
footprint SOT-23-5
pins: 1 VIN (power), 2 GND (power), 3 ~{{SHDN}} (in), 4 BYP (in), 5 VOUT (power)

## APE8865Y5-29-HF-3
designator *  value APE8865Y5-29-HF-3
ki_keywords: 300mA LDO Regulator Fixed Positive; ki_description: 300mA Low Dropout Voltage Regulator, Fixed Output 2.9V, SOT-23-5; ki_fp_filters: SOT?23*; Footprint: Package_TO_SOT_SMD:SOT-23-5; Supplier: http://www.tme.eu/fr/Document/ced3461ed31ea70a3c416fb648e0cde7/APE8865-3.pdf
footprint SOT-23-5
pins: 1 VIN (power), 2 GND (power), 3 ~{{SHDN}} (in), 4 BYP (in), 5 VOUT (power)
